# Altium footprint library AD_Lib.PcbLib: 508 footprints (part 22 of 32)
Each footprint in its own frame and in the unit in brackets; x right, y up, seen from the top. Pads: shape width x height; smd on the part's side, far side on the other; paste and mask are expansions set on the pad; w line width, h text height; cw(c..) or ccw(c..) is an arc to the next point about the centre after c.
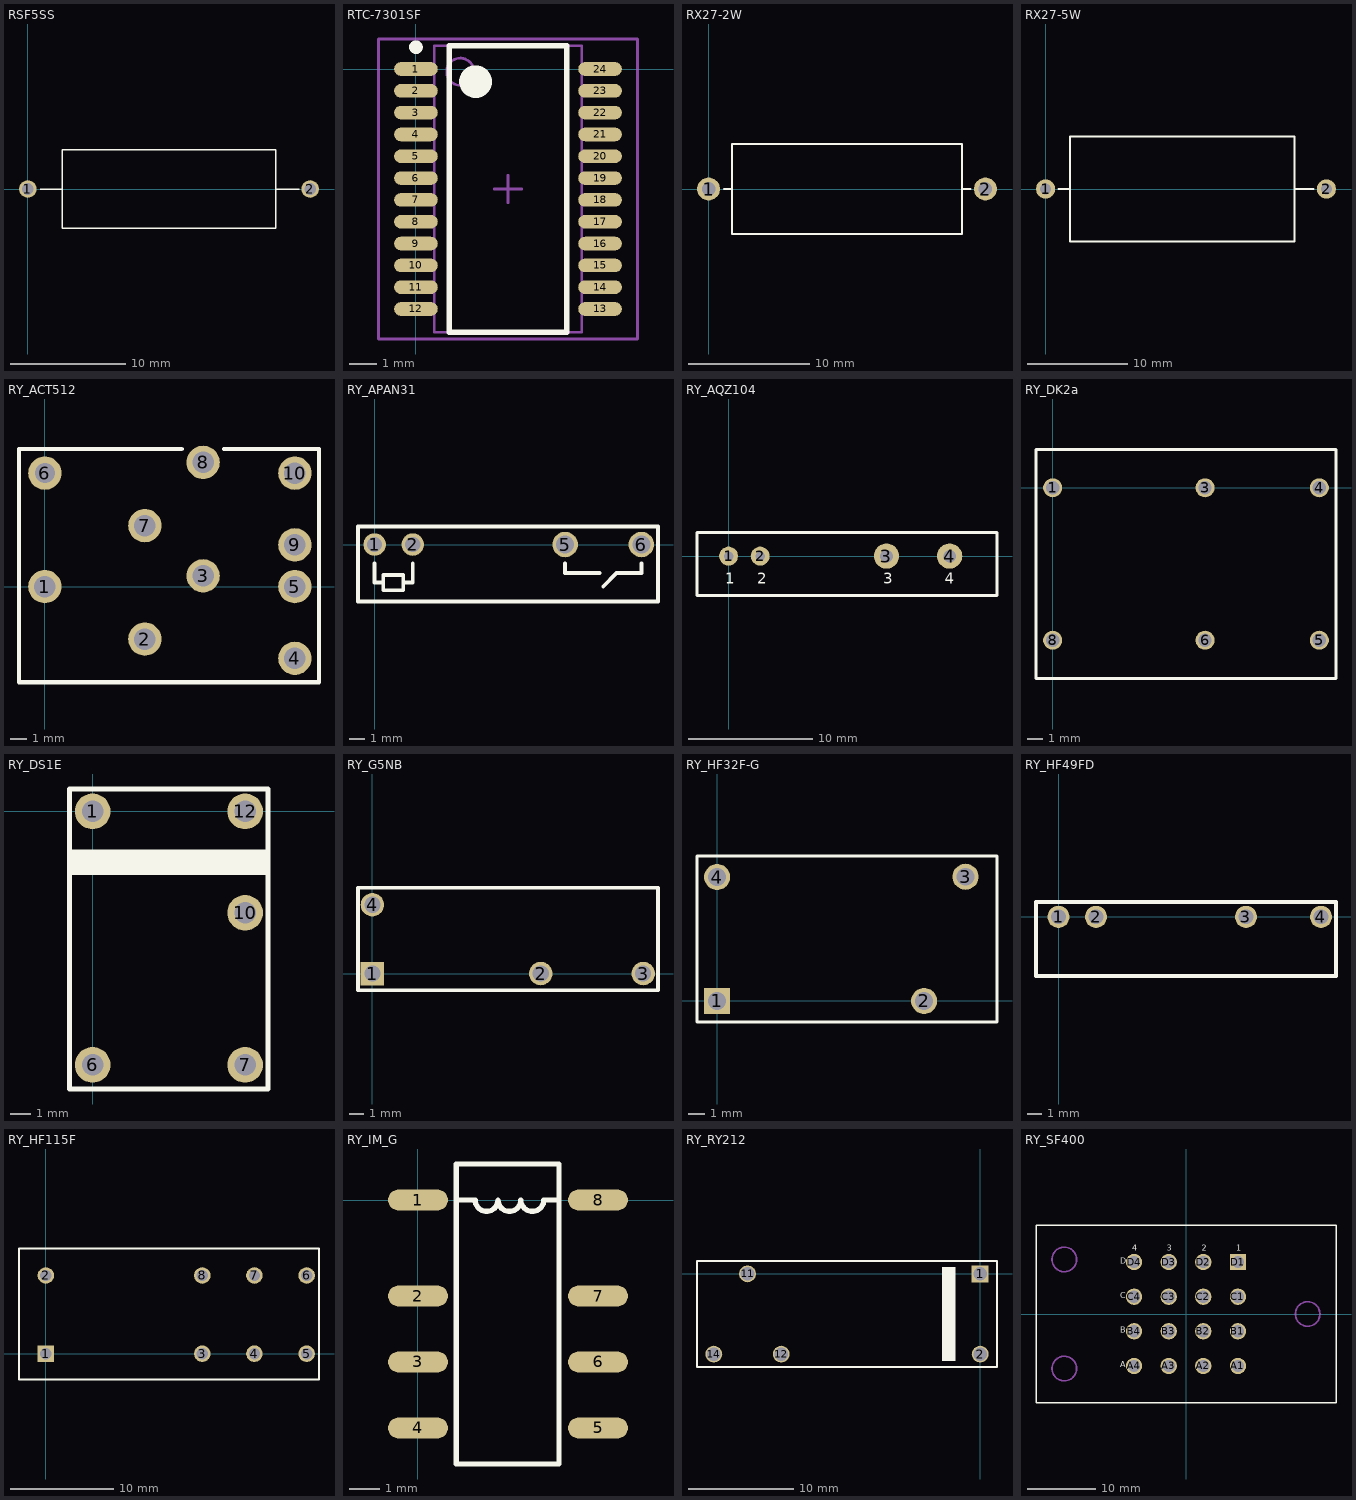
[diagram p21: the footprints below, top view; thin cyan lines are the x and y axes]

## RSF5SS [mil]
pads (2):
  round 60 hole 39.37: 1(0,0) 2(965.83,0)
Top Overlay:
  lines w5: 42.72,0 117.72,0 ; 847.72,0 927.72,0 ; 118.35,-135.04 847.72,-135.04 847.72,135.04 118.35,135.04 118.35,-135.04

## RTC-7301SF [mm] "RTC，非标准SSOP-24"
height 2
pads (24):
  oval 1.6x0.5 smd: 1(0,0) 2(0,-0.8) 3(0,-1.6) 4(0,-2.4) 5(0,-3.2) 6(0,-4) 7(0,-4.8) 8(0,-5.6) 9(0,-6.4) 10(0,-7.2) 11(0,-8) 12(0,-8.8) 13(6.75,-8.8) 14(6.75,-8) 15(6.75,-7.2) 16(6.75,-6.4) 17(6.75,-5.6) 18(6.75,-4.8) 19(6.75,-4) 20(6.75,-3.2) 21(6.75,-2.4) 22(6.75,-1.6) 23(6.75,-0.8) 24(6.75,0)
Top Overlay:
  circle w0.6: c2.186,-0.463 r0.3
  circle w0.25: c0,0.8 r0.125
  lines w0.2: 1.216,-9.65 5.534,-9.65 5.534,0.85 1.216,0.85 1.216,-9.65
Mechanical 13:
  circle w0.1: c1.625,-0.1 r0.5
  lines w0.1: 0.675,-9.65 6.075,-9.65 6.075,0.85 0.675,0.85 0.675,-9.65
Mechanical 15:
  lines w0.1: 2.875,-4.4 3.875,-4.4 ; 3.375,-4.9 3.375,-3.9 ; -1.375,-9.9 8.125,-9.9 8.125,1.1 -1.375,1.1 -1.375,-9.9
3D body: height 2, standoff 0.15, extent 0.675,-9.65 6.075,0.85

## RX27-2W [mil]
height 222
pads (2):
  round 75 hole 44: 1(0,0) 2(898.03,0)
Top Overlay:
  lines w6: 50,0 75,0 ; 823.03,0 850,0 ; 76,-145.5 76,145.5 822.03,145.5 822.03,-145.5 76,-145.5

## RX27-5W [mil]
height 222
pads (2):
  round 75 hole 44: 1(0,0) 2(1100,0)
Top Overlay:
  lines w6: 50,0 90,0 ; 97,-206.5 97,206.5 ; 980,0 1050,0
  lines w7.87: 95,-205 975,-205 975,205 692.56,205 327.44,205 95,205 95,-205
Mechanical 8:
  text "1" at 10,0 h25
  text "2" at 1110,0 h25

## RY_ACT512 [mm] "Panasonic之2组继电器"
height 13.5
pads (10):
  round 2 hole 1.3: 1(0,0) 2(6,-3.15) 3(9.5,0.65) 4(15,-4.3) 5(15,0) 7(6,3.657) 8(9.5,7.457) 9(15,2.507) 10(15,6.807)
  round 2 hole 1.2: 6(0,6.807)
Top Overlay:
  lines w0.254: 8.212,8.257 -1.55,8.257 -1.55,-5.743 16.45,-5.743 16.45,8.257 10.752,8.257
Bottom Overlay:
  text "10" at 13.8,6.337 h1.52
  text "8" at 7.958,6.591 h1.52
  text "9" at 13.546,2.019 h1.52
  text "5" at 13.546,-0.521 h1.52
  text "4" at 13.546,-4.839 h1.52
  text "3" at 9.736,-1.537 h1.52
  text "7" at 6.434,1.257 h1.52
  text "2" at 6.434,-1.791 h1.52
  text "6" at 2.116,6.337 h1.52
  text "1" at 0.084,-2.299 h1.52

## RY_APAN31 [mm] "Panasonic之 PA-N系列继电器，APAN31xx"
height 12.5
pads (4):
  round 1.5 hole 1: 1(0,0) 2(2.54,0)
  round 1.7 hole 1.2: 5(12.7,0) 6(17.78,0)
Top Overlay:
  lines w0.254: -1.11,-3.8 18.89,-3.8 18.89,1.2 -1.11,1.2 -1.11,-3.79 ; 0,-1.27 0,-2.54 0.5,-2.54 ; 2.04,-2.54 2.54,-2.54 2.54,-1.27 ; 12.7,-1.27 12.7,-1.905 14.986,-1.905 ; 15.24,-2.794 16.129,-1.905 17.78,-1.905 17.78,-1.27 ; 0.573,-3.048 1.905,-3.048 1.905,-2.032 0.573,-2.032 0.573,-3.048

## RY_AQZ104 [mil] "Panasonic之固态继电器"
height 562.99
pads (4):
  round 60 hole 30: 1(0,0) 2(100,0)
  round 80 hole 40: 3(500,0) 4(700,0)
Top Overlay:
  lines w10: -100,-125 850,-125 850,75 -100,75 -100,-125
  text "1" at -10,-100 h60
  text "2" at 90,-100 h60
  text "3" at 490,-100 h60
  text "4" at 685,-100 h60

## RY_DK2a [mil] "Panasonic之DK系列继电器"
height 393.7
pads (6):
  round 50 hole 35: 1(0,0) 3(400,0) 4(700,0) 5(700,-400) 6(400,-400) 8(0,-400)
Top Overlay:
  lines w7.87: -43.7,-500 743.7,-500 743.7,100 -43.7,100 -43.7,-500
Bottom Overlay:
  lines w7: 0,-350 0,-300 cw(c0,-275) 0,-250 cw(c0,-225) 0,-200 cw(c0,-175) 0,-150 cw(c0,-125) 0,-100 0,-50
  lines w11.81: 400,-350 400,-300 725,-225 ; 400,-50 400,-100 725,-175 ; 675,-300 700,-275 ; 675,-100 700,-125 ; 700,-350 700,-275 ; 700,-50 700,-125 ; 725,-300 700,-275 ; 725,-100 700,-125
  text "+" at 85,-440 h118.11
  text "NO" at 575,-425 h60
  text "NO" at 575,-25 h60
  text "4" at 715,40 h60
  text "3" at 410,40 h60
  text "1" at 10,40 h60
  text "5" at 710,-480 h60
  text "6" at 410,-480 h60
  text "8" at 10,-480 h60

## RY_DS1E [mil] "DS1E系列继电器（Matsushita Electric Works）"
height 389.76
pads (5):
  round 70 hole 42 mask+2: 1(0,0) 6(0,-497.5) 7(299.5,-497.5) 10(299.5,-199) 12(299.5,0)
Top Overlay:
  rectangle: -45,-125 345,-75
  lines w10: -6.5,-545 344.5,-545 344.5,44 -45,44 -45,-545 22,-545

## RY_G5NB [mm] "欧姆龙之G5NB系列继电器，如G5NB-1A-E-DC5V"
height 15.3
pads (4):
  rect 1.6x1.6 hole 1.1: 1(0,0)
  round 1.6 hole 1.1: 2(11.5,0) 3(18.5,0) 4(0,4.7)
Top Overlay:
  lines w0.254: -0.985,-1.149 -0.985,5.871 19.515,5.871 19.515,-1.149 -0.985,-1.149
Bottom Overlay:
  lines w0.152: 1.27,0 2.54,0 2.54,1.524 ; 1.27,4.7 2.539,4.7 2.54,4.699 2.54,3.175 ; 11.43,1.27 11.43,2.54 14.605,2.54 ; 14.605,3.81 15.875,2.54 18.415,2.54 18.415,1.27 ; 1.905,1.524 1.905,3.175 3.175,3.175 3.175,1.524 1.905,1.524

## RY_HF32F-G [mm] "宏发之HF32F-G系列继电器，如HF32F-G/012-HS"
height 15.3
pads (4):
  rect 1.6x1.6 hole 1.1: 1(0,0)
  round 1.6 hole 1.1: 2(12.7,0) 3(15.24,7.62) 4(0,7.6)
Top Overlay:
  lines w0.2: 17.163,-1.29 -1.237,-1.29 -1.237,8.89 17.163,8.89 17.163,-1.27 ; 17.17,8.56 17.17,8.89
Bottom Overlay:
  lines w0.254: 0,1.27 0,2.54 ; 0,6.35 0,5.08 ; 13.97,0 15.24,0 15.24,2.54 16.51,3.81 ; 15.24,3.81 15.24,6.35 ; 0,5.08 -0.635,5.08 -0.635,2.54 0.635,2.54 0.635,5.08 0,5.08

## RY_HF49FD [mm] "宏发之HF49FD系列继电器，如HF49FD/005-1H11"
height 12.5
pads (4):
  round 1.5 hole 1: 1(0,0) 2(2.54,0) 3(12.7,0) 4(17.78,0)
Top Overlay:
  lines w0.254: -1.524,-4 -1.524,1 18.796,1 18.796,-4 -1.524,-4

## RY_HF115F [mm] "宏发之HF115F系列继电器，如HF115F-024-2ZS4"
height 15.7
pads (8):
  rect 1.6x1.6 hole 1.1: 1(0,0)
  round 1.6 hole 1.1: 2(0,7.56) 3(15.12,0) 4(20.16,0) 5(25.2,0) 6(25.2,7.56) 7(20.16,7.56) 8(15.12,7.56)
Top Overlay:
  lines w0.203: -2.6,-2.514 26.4,-2.514 26.4,10.186 -2.6,10.186 -2.6,-2.514
Bottom Overlay:
  lines w0.152: 0,1.27 0,2.54 ; 0,6.35 0,5.08 ; 15.113,1.27 15.113,2.48 19.558,2.48 ; 15.113,6.35 15.113,5.207 19.558,5.207 ; 19.05,3.115 20.193,1.972 20.193,1.27 ; 19.05,4.572 20.193,5.715 20.193,6.35 ; 20.762,2.48 25.207,2.48 25.207,1.27 ; 20.762,5.207 25.207,5.207 25.207,6.35 ; 0,2.54 -1.27,2.54 -1.27,5.08 0,5.08 ; 0,2.54 1.27,2.54 1.27,5.08 0,5.08

## RY_IM_G [mm] "IM系列继电器，Gull Wings封装。如IM03GR"
height 5.639
pads (8):
  oval 2x0.7 smd: 1(0,0) 2(0,-3.2) 3(0,-5.4) 4(0,-7.6) 5(6,-7.6) 6(6,-5.4) 7(6,-3.2) 8(6,0)
Top Overlay:
  lines w0.178: 1.27,0 1.905,0 ccw(c2.286,0) 2.667,0 ccw(c3.048,0) 3.429,0 ccw(c3.81,0) 4.191,0 4.699,0 ; 1.27,-8.8 1.27,1.2 4.699,1.2 4.699,-8.8 1.27,-8.8

## RY_RY212 [mm] "继电器RY212直插系列，如RY212012"
height 12.3
pads (5):
  rect 1.6x1.6 hole 1.3: 1(0,0)
  round 1.6 hole 1.3: 2(0,-7.62) 11(-22.1,0) 12(-18.9,-7.62) 14(-25.3,-7.62)
Top Overlay:
  region: -2.363,0.635 -3.633,0.635 -3.633,-8.255 -2.363,-8.255
  lines w0.2: -26.9,-8.86 1.6,-8.86 1.6,1.24 -26.9,1.24 -26.9,-8.86
Bottom Overlay:
  lines w0.152: 0.05,-6.35 0.05,-5.634 ; 0.05,-1.905 0.05,-1.27
  lines w0.178: 0.05,-5.634 ccw(c-0.043,-5.261) 0.05,-4.888 ccw(c-0.043,-4.515) 0.05,-4.142 ccw(c-0.043,-3.769) 0.05,-3.397 ccw(c-0.043,-3.024) 0.05,-2.651 ccw(c-0.043,-2.278) 0.05,-1.905
  lines w0.2: -26.9,1.24 -26.9,-8.86 1.6,-8.86 1.6,1.24 ; -26.9,1.24 1.6,1.24
  lines w0.3: -25.3,-6.477 -25.3,-2.54 -24.155,-2.54 ; -22.1,-1.143 -22.1,-1.852 -20.791,-3.161 ; -21.44,-2.54 -18.9,-2.54 -18.9,-6.477
  text "COMM" at -16.36,-0.635 h2.03
  text "A1" at -1.395,-0.635 h2.03
  text "A2" at -1.474,-8.255 h2.03
  text "NO" at -22.075,-8.255 h2.03
  text "NC" at -15.598,-8.255 h2.03

## RY_SF400 [mm] "LEACH法国力奇F470继电器底座"
height 19.3
pads (16):
  round 2.4 hole 1.8: A1(7.62,-7.62) A2(2.54,-7.62) A3(-2.54,-7.62) A4(-7.62,-7.62) B1(7.62,-2.54) B2(2.54,-2.54) B3(-2.54,-2.54) B4(-7.62,-2.54) C1(7.62,2.54) C2(2.54,2.54) C3(-2.54,2.54) C4(-7.62,2.54) D2(2.54,7.62) D3(-2.54,7.62) D4(-7.62,7.62)
  rect 2.4x2.4 hole 1.8: D1(7.62,7.62)
Top Overlay:
  lines w0.2: -22,-13 22,-13 22,13 -22,13 -22,-13
  text "4" at -7.874,9.017 h1.5
  text "3" at -2.794,9.017 h1.5
  text "2" at 2.286,9.017 h1.5
  text "D" at -9.652,7.112 h1.5
  text "C" at -9.652,2.032 h1.5
  text "B" at -9.652,-3.048 h1.5
  text "A" at -9.652,-8.128 h1.5
  text "1" at 7.366,9.017 h1.5
Bottom Overlay:
  circle w0.254: c2.54,7.62 r2.618
  circle w0.254: c2.54,-7.62 r2.618
  text "X1" at 3.937,-12.573 h3
  text "X2" at 3.937,10.795 h3
  text "4" at -7.366,9.017 h1.5
  text "3" at -2.286,9.017 h1.5
  text "2" at 2.794,9.017 h1.5
  text "D" at -9.144,7.112 h1.5
  text "C" at -9.144,2.032 h1.5
  text "B" at -9.144,-3.048 h1.5
  text "A" at -9.144,-8.128 h1.5
  text "1" at 7.874,9.017 h1.5
Mechanical 1:
  circle w0.254: c-17.85,8.001 r1.8
  circle w0.254: c-17.85,-8.001 r1.8
  circle w0.254: c17.85,0 r1.8